# Altium footprint library North POLE.PcbLib: 419 footprints (part 19 of 27)
Each footprint in its own frame and in the unit in brackets; x right, y up, seen from the top. Pads: shape width x height; smd on the part's side, far side on the other; paste and mask are expansions set on the pad; w line width, h text height; cw(c..) or ccw(c..) is an arc to the next point about the centre after c.
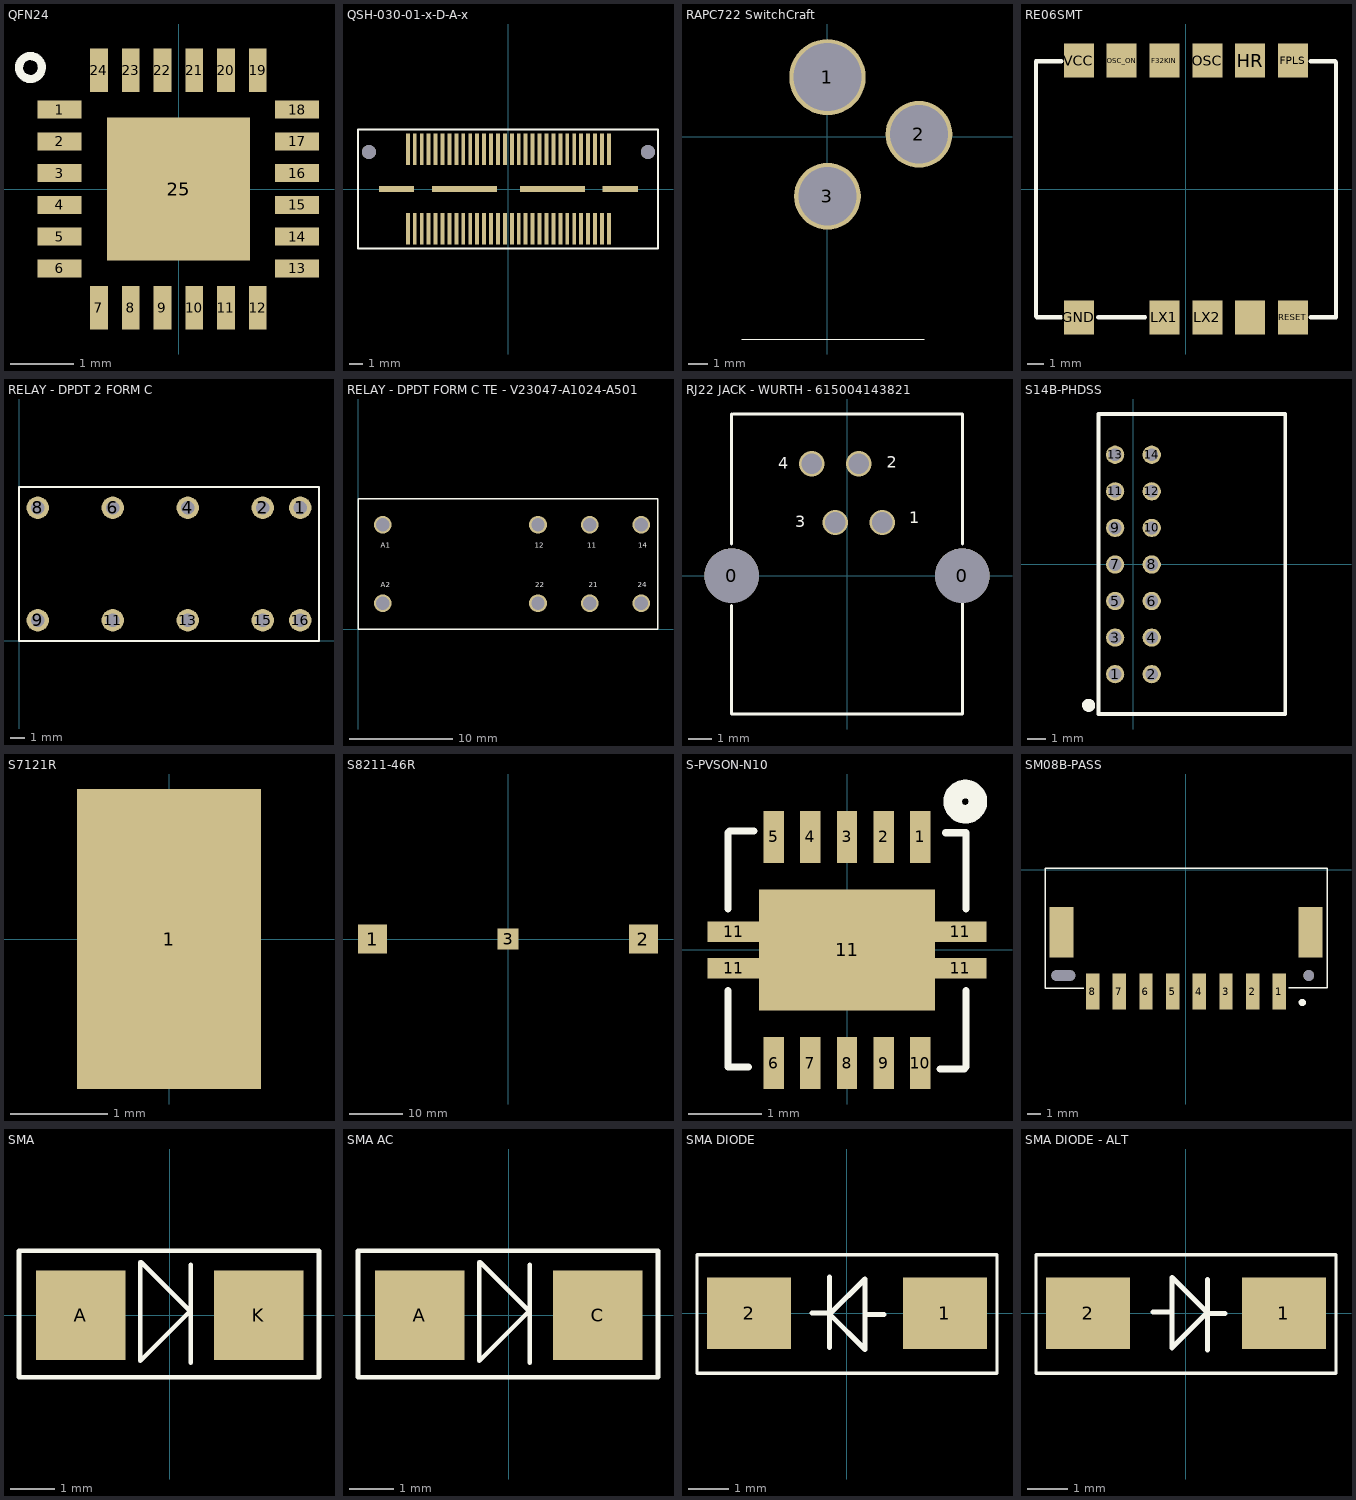
[diagram p18: the footprints below, top view; thin cyan lines are the x and y axes]

## QFN24 [mm]
pads (25):
  rect 0.69x0.28 smd: 1(-1.875,1.25) 2(-1.875,0.75) 3(-1.875,0.25) 4(-1.875,-0.25) 5(-1.875,-0.75) 6(-1.875,-1.25) 13(1.865,-1.25) 14(1.865,-0.75) 15(1.865,-0.25) 16(1.865,0.25) 17(1.865,0.75) 18(1.865,1.25)
  rect 0.28x0.69 smd: 7(-1.255,-1.87) 8(-0.755,-1.87) 9(-0.255,-1.87) 10(0.245,-1.87) 11(0.745,-1.87) 12(1.245,-1.87) 19(1.245,1.87) 20(0.745,1.87) 21(0.245,1.87) 22(-0.255,1.87) 23(-0.755,1.87) 24(-1.255,1.87)
  rect 2.25x2.25 smd mask+0.08: 25(0,0)
Top Overlay:
  lines w0.127: -2.175,2 ccw(c-2.333,1.912) -2.162,1.969

## QSH-030-01-x-D-A-x [mm]
pads (66):
  rect 0.279x2.27 smd: 1(-7.25,-2.865) 2(-7.25,2.865) 3(-6.75,-2.865) 4(-6.75,2.865) 5(-6.25,-2.865) 6(-6.25,2.865) 7(-5.75,-2.865) 8(-5.75,2.865) 9(-5.25,-2.865) 10(-5.25,2.865) 11(-4.75,-2.865) 12(-4.75,2.865) 13(-4.25,-2.865) 14(-4.25,2.865) 15(-3.75,-2.865) 16(-3.75,2.865) 17(-3.25,-2.865) 18(-3.25,2.865) 19(-2.75,-2.865) 20(-2.75,2.865) 21(-2.25,-2.865) 22(-2.25,2.865) 23(-1.75,-2.865) 24(-1.75,2.865) 25(-1.25,-2.865) 26(-1.25,2.865) 27(-0.75,-2.865) 28(-0.75,2.865) 29(-0.25,-2.865) 30(-0.25,2.865) 31(0.25,-2.865) 32(0.25,2.865) 33(0.75,-2.865) 34(0.75,2.865) 35(1.25,-2.865) 36(1.25,2.865) 37(1.75,-2.865) 38(1.75,2.865) 39(2.25,-2.865) 40(2.25,2.865) 41(2.75,-2.865) 42(2.75,2.865) 43(3.25,-2.865) 44(3.25,2.865) 45(3.75,-2.865) 46(3.75,2.865) 47(4.25,-2.865) 48(4.25,2.865) 49(4.75,-2.865) 50(4.75,2.865) 51(5.25,-2.865) 52(5.25,2.865) 53(5.75,-2.865) 54(5.75,2.865) 55(6.25,-2.865) 56(6.25,2.865) 57(6.75,-2.865) 58(6.75,2.865) 59(7.25,-2.865) 60(7.25,2.865)
  rect 2.54x0.43 smd: 61(-8.065,0) 61(8.065,0)
  rect 4.7x0.43 smd: 61(-3.175,0) 61(3.175,0)
  round 1.02 hole 1.02 unplated mask+0.08: ""(-10.065,2.67) ""(10.065,2.67)
Top Overlay:
  lines w0.127: -10.846,-4.293 10.795,-4.293 10.795,4.293 -10.846,4.293 -10.846,-4.293
3D body: height 3.24, standoff -0.76, extent -10.674,-3.746 10.636,3.747

## RAPC722 SwitchCraft [mm]
pads (3):
  round 4 hole 3.56: 1(0,3.125)
  round 3.5 hole 3.05: 2(4.8,0.125) 3(0,-3.125)
Top Overlay:
  lines w0.05: -4.501,-10.615 5.085,-10.615
3D body: height 10.92, standoff -3.56, extent -4.473,-10.551 5.052,4.054

## RE06SMT [mil] "Polar wireless receiver module"
pads (11):
  rect 70x80 smd: F32KIN(-50,300) FPLS(250,300) GND(-250,-300) HR(150,300) LX1(-50,-300) LX2(50,-300) OSC(50,300) OSC_ON(-150,300) RESET(250,-300) VCC(-250,300) WIDB_DET(150,-300)
Top Overlay:
  lines w10: -290.94,-299.21 -347.64,-299.21 -350,-296.85 -350,298.43 -290.94,298.43 ; -204.72,-299.21 -95.67,-299.21 ; 291.34,-299.21 350.39,-299.21 350.39,296.06 ; 291.34,298.43 348.03,298.43

## RELAY - DPDT 2 FORM C [mil] "Panasonic DS2E, 2-coil latching"
pads (10):
  round 60 hole 35: 1(750,355) 2(650,355) 4(450,355) 6(250,355) 8(50,355) 9(50,55) 11(250,55) 13(450,55) 15(650,55) 16(750,55)
Top Overlay:
  lines w5: 0,0 0,410 800,410 800,0 0,0

## RELAY - DPDT FORM C TE - V23047-A1024-A501 [mm]
via 27.4,2.5 diameter 1.7 hole 1.3
via 27.4,10.1 diameter 1.7 hole 1.3
via 22.4,10.1 diameter 1.7 hole 1.3
via 17.4,10.1 diameter 1.7 hole 1.3
via 22.4,2.5 diameter 1.7 hole 1.3
via 17.4,2.5 diameter 1.7 hole 1.3
via 2.4,2.5 diameter 1.7 hole 1.3
via 2.4,10.1 diameter 1.7 hole 1.3
Top Overlay:
  lines w0.127: 0,0 0,12.6 29,12.6 29,0 0,0
  text "24" at 27.026,4.064 h0.5
  text "14" at 27.076,7.874 h0.5
  text "21" at 22.301,4.064 h0.5
  text "11" at 22.174,7.874 h0.5
  text "12" at 17.069,7.874 h0.5
  text "22" at 17.12,4.064 h0.5
  text "A2" at 2.184,4.064 h0.5
  text "A1" at 2.184,7.874 h0.5

## RJ22 JACK - WURTH - 615004143821 [mm]
pads (2):
  round 2.36 hole 2.36 unplated: 0(-5,0) 0(5,0)
via 0.51,4.84 diameter 1.1 hole 0.9
via 1.53,2.3 diameter 1.1 hole 0.9
via -1.53,4.84 diameter 1.1 hole 0.9
via -0.51,2.3 diameter 1.1 hole 0.9
Top Overlay:
  lines w0.127: -5,-1.295 -5,-6 5,-6 5,-1.219 ; -5,1.372 -5,7 ; -4.934,7 5,7 5,1.372
  text "1" at 2.692,2.261 h0.5
  text "4" at -2.972,4.623 h0.5
  text "2" at 1.727,4.674 h0.5
  text "3" at -2.235,2.083 h0.5

## S14B-PHDSS [mm] "0.156-inch-separation 1x2 header with shroud"
pads (14):
  round 1 hole 0.7: 1(-1,-6) 2(1,-6) 3(-1,-4) 4(1,-4) 5(-1,-2) 6(1,-2) 7(-1,0) 8(1,0) 9(-1,2) 10(1,2) 11(-1,4) 12(1,4) 13(-1,6) 14(1,6)
Top Overlay:
  lines w0.203: -1.905,-8.179 -1.905,8.23 8.306,8.23 8.306,-8.179 -1.905,-8.179
  lines w0.508: -2.394,-7.615 ccw(c-2.449,-7.703) -2.362,-7.645
3D body: height 5, standoff -3, extent -1.499,-7.95 8.001,7.95

## S7121R [mm] "PCB mounted battery connection"
pads (1):
  rect 1.9x3.1 smd: 1(0,0)

## S8211-46R [mm] "CR2032 battery holder"
height 4
pads (3):
  rect 5.5x5.5 smd: 1(-25.601,0) 2(25.601,0)
  rect 4x4 smd: 3(0,0)

## S-PVSON-N10 [mm]
pads (15):
  rect 0.28x0.71 smd paste+0 mask+0.05: 1(1,1.545) 2(0.5,1.545) 3(0,1.545) 4(-0.5,1.545) 5(-1,1.545) 6(-1,-1.545) 7(-0.5,-1.545) 8(0,-1.545) 9(0.5,-1.545) 10(1,-1.545)
  rect 0.71x0.28 smd paste+0 mask+0.05: 11(-1.549,-0.25) 11(-1.549,0.25) 11(1.549,-0.25) 11(1.549,0.25)
  rect 2.4x1.65 smd mask+0.05: 11(0,0)
Top Overlay:
  lines w0.1: -1.626,-0.559 -1.626,-1.6 -1.346,-1.6 ; -1.626,0.559 -1.626,1.6 -1.6,1.626 -1.27,1.626 ; 1.27,-1.626 1.6,-1.626 1.626,-1.6 1.626,-0.559 ; 1.346,1.6 1.626,1.6 1.626,0.559
  lines w0.254: 1.727,2.159 ccw(c1.616,2.027) 1.759,2.124
3D body: height 1, standoff 0, extent -1.499,-1.498 1.499,1.499

## SM08B-PASS [mm]
pads (12):
  rect 1x2.7 smd: 1(7,-9.15) 2(5,-9.15) 3(3,-9.15) 4(1,-9.15) 5(-1,-9.15) 6(-3,-9.15) 7(-5,-9.15) 8(-7,-9.15)
  rect 1.8x3.8 smd: ""(-9.35,-4.7) ""(9.35,-4.7)
  round 0 hole 0.8 slot 1.8 at 0 deg unplated mask+0.08: ""(-9.2,-7.95)
  round 0.8 hole 0.8 unplated mask+0.08: ""(9.2,-7.95)
Top Overlay:
  lines w0.1: -7.678,-8.893 -10.551,-8.893 -10.551,0.079 10.61,0.079 10.61,-8.882 7.696,-8.882
  lines w0.254: 8.813,-9.854 ccw(c8.722,-9.971) 8.835,-9.875
Top Solder:
  lines w1: -9.716,-7.945 -8.677,-7.945
3D body: height 5.7, standoff 0, extent -10.127,-8.613 10.096,0.048

## SMA [mil]
pads (2):
  rect 78.8x78.8 smd: A(-78.5,0) K(78.5,0)
Top Overlay:
  lines w3.94: -25.98,46.85 -25.98,-40.16 18.5,4.33 18.5,-41.73 ; -25.2,46.85 18.5,3.15 18.5,44.49
  lines w4: -133.07,-54.72 -133.07,57.09 131.5,57.09 131.5,-54.72 -133.07,-54.72

## SMA AC [mil]
pads (2):
  rect 78.8x78.8 smd: A(-78.5,0) C(78.5,0)
Top Overlay:
  lines w3.94: -25.98,46.85 -25.98,-40.16 18.5,4.33 18.5,-41.73 ; -25.2,46.85 18.5,3.15 18.5,44.49
  lines w4: -133.07,-54.72 131.5,-54.72 131.5,57.09 -133.07,57.09 -133.07,-54.72

## SMA DIODE [mil]
pads (2):
  rect 82x70 smd mask+3.15: 1(95.98,0) 2(-96,0)
Top Overlay:
  lines w3: -147.01,-58.66 -147.01,57.52 147.01,57.52 147.01,-58.66 -147.01,-58.66
  lines w5: -34.41,0.36 -16.23,0.36 ; -17.16,-33.3 -17.16,35.79 ; -16.83,-0.76 17.68,-35.27 17.68,33.83 -16.83,-0.68 ; 18.42,-1.22 36.1,-1.22
3D body: height 90.75, standoff -3.94, extent -102.36,-51.05 102.36,51.31

## SMA DIODE - ALT [mil]
pads (2):
  rect 82x70 smd mask+3.15: 1(95.98,0) 2(-96,0)
Top Overlay:
  lines w3: -147.01,-58.66 -147.01,57.52 147.01,57.52 147.01,-58.66 -147.01,-58.66
  lines w5: -32.17,1.34 -14.48,1.34 ; 20.16,-0.23 38.35,-0.23 ; 20.77,0.81 -13.74,-33.7 -13.74,35.39 20.77,0.88 ; 21.1,-35.67 21.1,33.43
3D body: height 90.75, standoff -3.94, extent -102.36,-51.06 102.36,51.3